# Altium footprint library PcbLib.PcbLib: 142 footprints (part 2 of 9)
Each footprint in its own frame and in the unit in brackets; x right, y up, seen from the top. Pads: shape width x height; smd on the part's side, far side on the other; paste and mask are expansions set on the pad; w line width, h text height; cw(c..) or ccw(c..) is an arc to the next point about the centre after c.
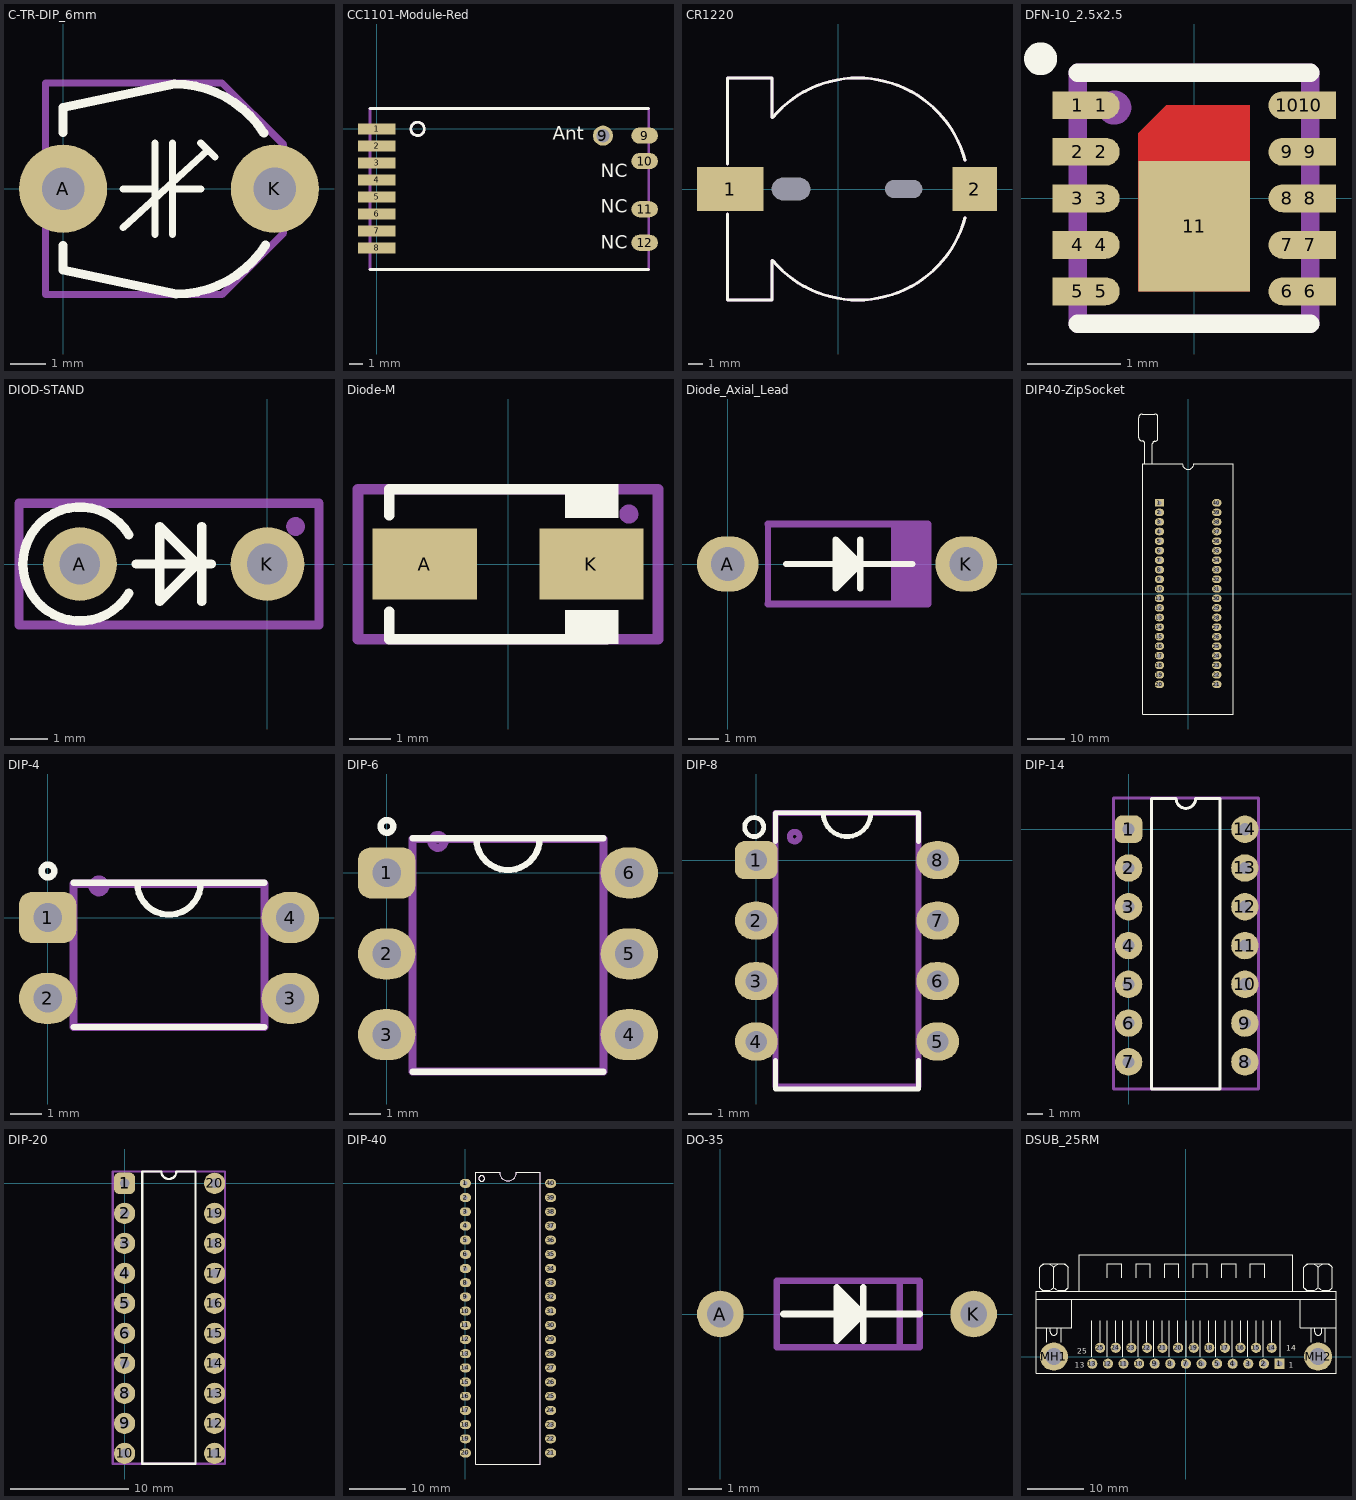
[diagram p1: the footprints below, top view; thin cyan lines are the x and y axes]

## C-TR-DIP_6mm [mm]
pads (2):
  round 2.5 hole 1.2 mask+0.102: A(0,0) K(6,0)
Top Overlay:
  lines w0.2: 1.7,-1.1 4.1,1.1 3.9,1.3 4.3,0.9 ; 1.7,0 2.6,0 ; 2.6,-1.3 2.6,1.3 ; 3.1,-1.3 3.1,1.3 ; 3.1,0 3.9,0
  lines w0.254: 0,-1.6 0,-2.3 3.204,-2.982 ccw(c3.204,0.02) 5.74,-1.586 ; 0,1.6 0,2.3 3.152,2.971 cw(c3.152,-0.031) 5.688,1.575
Mechanical 29:
  lines w0.2: -0.5,-3 -0.5,3 4.5,3 6.25,1.25 6.25,-1.25 4.5,-3 -0.5,-3
  text ".Designator" at 1.7,-0.467 h1
3D body "Trimmer Cap - Green.stp": height 5.08, standoff -2.53, extent -0.556,-3.046 6.207,3.046

## CC1101-Module-Red [mm]
pads (13):
  rect 2.8x0.8 smd: 1(0,0) 2(0,-1.27) 3(0,-2.54) 4(0,-3.81) 5(0,-5.08) 6(0,-6.35) 7(0,-7.62) 8(0,-8.89)
  round 1.5 hole 1: 9(16.891,-0.508)
  oval 2x1.2 smd: 9(20,-0.5) 10(20,-2.4) 11(20,-6) 12(20,-8.5)
Top Overlay:
  circle w0.2: c3.048,0 r0.5
  lines w0.2: -0.508,-10.5 20.292,-10.5 ; -0.508,1.524 20.292,1.524
  text "Ant" at 13.154,-0.816 h1
  text "NC" at 16.71,-3.61 h1
  text "NC" at 16.71,-6.277 h1
  text "NC" at 16.71,-8.944 h1
Mechanical 29:
  circle w0.2: c3.048,0 r0.5
  lines w0.2: -0.508,-10.5 -0.508,1.5 20.32,1.5 20.32,-10.5 -0.508,-10.5
  text ".Designator" at 6.2,-5.634 h2
3D body: height 0.8, standoff 0, extent -0.508,-10.5 20.32,1.5
3D body: height 2, standoff 1, extent 5.5,-5 10,-1
3D body: height 1.5, standoff 1, extent 6.5,-9.5 9.5,-7.5

## CR1220 [mm] "COIN CELL BATTERY HOLDER 1220 12mm"
height 2
pads (4):
  rect 4.5x3 smd: 1(-7.3,0)
  rect 3x3 smd: 2(9.2,0)
  round 1 hole 1.5 slot 2.6 at 0 deg unplated: ""(-3.2,0)
  round 1 hole 1.2 slot 2.5 at 0 deg unplated: ""(4.4,0)
Top Overlay:
  lines w0.2: -7.5,-1.7 -7.5,-7.5 -4.5,-7.5 -4.5,-4.821 ; -7.5,1.7 -7.5,7.5 -4.5,7.5 -4.5,4.821 ; -4.445,-4.821 ccw(c1.3,0) 8.544,-1.941 ; -4.445,4.821 cw(c1.3,0) 8.544,1.941
Mechanical 29:
  lines w0.2: -7.5,-1.7 -7.5,-7.5 -4.5,-7.5 -4.5,-4.821 ; -7.5,1.7 -7.5,7.5 -4.5,7.5 -4.5,4.821 ; -4.445,-4.821 ccw(c1.3,0) 8.544,-1.941 ; -4.445,4.821 cw(c1.3,0) 8.544,1.941
  text ".Designator" at -2.6,-1.6 h3
3D body "SMD Battery Holder.step": height 4.26, standoff -0.49, extent -8.5,-7.4 10.3,7.349

## DFN-10_2.5x2.5 [mm]
pads (21):
  rect 0.55x0.3 smd paste+0 mask+0.04: 1(-1.25,1) 2(-1.25,0.5) 3(-1.25,0) 4(-1.25,-0.5) 5(-1.25,-1) 6(1.25,-1) 7(1.25,-0.5) 8(1.25,0) 9(1.25,0.5) 10(1.25,1)
  oval 0.4x0.3 smd paste+0 mask+0.04: 1(-1,1) 2(-1,0.5) 3(-1,0) 4(-1,-0.5) 5(-1,-1) 6(1,-1) 7(1,-0.5) 8(1,0) 9(1,0.5) 10(1,1)
  rect 1.2x1.4 smd paste+0 mask+0.04: 11(0,-0.3)
Top Layer:
  region: -0.6,-1 0.6,-1 0.6,1 -0.3,1 -0.6,0.7
Top Overlay:
  circle w0.254: c-1.65,1.5 r0.05
  lines w0.2: -1.25,-1.35 1.25,-1.35 ; -1.25,1.35 1.25,1.35
Mechanical 29:
  circle w0.254: c-0.859,0.975 r0.056
  lines w0.2: -1.25,-1.35 1.25,-1.35 1.25,1.35 -1.25,1.35 -1.25,-1.35
  text ".Designator" at -0.7,-0.408 h0.8
3D body "Assem2.STEP": height 0.79, standoff -0.01, extent -1.26,-1.25 1.26,1.25

## DIOD-STAND [mm]
pads (2):
  round 2 hole 1.1: A(-5.08,0) K(0,0)
Top Overlay:
  lines w0.254: -3.755,-0.795 cw(c-5.08,0) -3.755,0.795 ; -3.556,0 -1.778,0 ; -1.778,-1.016 -1.778,1.016 ; -1.524,0 -1.905,0 ; -1.905,0 -2.921,-1.016 -2.921,1.016 -1.905,0
Mechanical 29:
  circle w0.254: c0.762,1.016 r0.127
  lines w0.254: -6.731,-1.651 1.397,-1.651 1.397,1.651 -6.731,1.651 -6.731,-1.651
  text ".Designator" at -4.572,-0.429 h1
3D body "stand-diod.STEP": height 7.78, standoff -1.5, extent -5.48,-1.505 1.425,1.505

## Diode-M [mm]
pads (2):
  rect 2.5x1.7 smd: A(-2,0) K(2,0)
Top Overlay:
  rectangle: 1.372,-1.923 2.65,-1.098
  rectangle: 1.372,1.1 2.65,1.925
  lines w0.254: -2.852,-1.8 2.375,-1.8 ; -2.852,-1.777 -2.852,-1.146 ; -2.848,1.168 -2.848,1.8 -2.7,1.8 2.375,1.8 ; 2.375,1.8 2.375,1.8
Mechanical 29:
  circle w0.254: c2.9,1.2 r0.1
  lines w0.254: -3.6,-1.8 3.6,-1.8 3.6,1.6 3.6,1.8 -1,1.8 -3.6,1.8 -3.6,-1.8
  text ".Designator" at -1.646,-0.413 h1
3D body "Diode SMD 1N4007-1.step": height 2.5, standoff 0.07, extent -2.65,-1.555 2.65,1.555

## Diode_Axial_Lead [mm]
pads (2):
  oval 2x1.8 hole 1.1: A(0,0) K(7.74,0)
Top Overlay:
  region: 3.5,0.8 4.3,0 3.5,-0.8
  lines w0.2: 1.9,0 6,0 ; 4.3,-0.8 4.3,0.8 ; 3.5,-0.8 4.3,0 3.5,0.8 3.5,-0.8
Mechanical 29:
  region: 1.3,-1.4 1.258,-1.4 1.2,-1.342 1.2,-1.258 1.258,-1.2 1.3,-1.2 5.3,-1.2 5.3,1.2 1.3,1.2 1.258,1.2 1.2,1.258 1.2,1.342 1.258,1.4 1.3,1.4 6.5,1.4 6.52,1.4 6.557,1.385 6.585,1.357 6.6,1.32 6.6,1.3 6.6,-1.3 6.6,-1.32 6.585,-1.357 6.557,-1.385 6.52,-1.4 6.5,-1.4
  lines w0.2: 5.4,-1.3 5.4,1.3 ; 1.3,-1.3 1.3,1.3 6.5,1.3 6.5,-1.3 1.3,-1.3
  text ".Designator" at 2.2,-0.367 h1
3D body "1n5819.STEP": height 2.85, standoff -0.5, extent -0.43,-1.351 8.17,1.351

## DIP40-ZipSocket [mm]
pads (40):
  rect 2.5x2 hole 1.1: 1(-7.62,24.13)
  oval 2.5x2 hole 1.1: 2(-7.62,21.59) 3(-7.62,19.05) 4(-7.62,16.51) 5(-7.62,13.97) 6(-7.62,11.43) 7(-7.62,8.89) 8(-7.62,6.35) 9(-7.62,3.81) 10(-7.62,1.27) 11(-7.62,-1.27) 12(-7.62,-3.81) 13(-7.62,-6.35) 14(-7.62,-8.89) 15(-7.62,-11.43) 16(-7.62,-13.97) 17(-7.62,-16.51) 18(-7.62,-19.05) 19(-7.62,-21.59) 20(-7.62,-24.13) 21(7.62,-24.13) 22(7.62,-21.59) 23(7.62,-19.05) 24(7.62,-16.51) 25(7.62,-13.97) 26(7.62,-11.43) 27(7.62,-8.89) 28(7.62,-6.35) 29(7.62,-3.81) 30(7.62,-1.27) 31(7.62,1.27) 32(7.62,3.81) 33(7.62,6.35) 34(7.62,8.89) 35(7.62,11.43) 36(7.62,13.97) 37(7.62,16.51) 38(7.62,19.05) 39(7.62,21.59) 40(7.62,24.13)
Top Overlay:
  lines w0.2: -11.557,34.5 -11.557,39.903 ccw(c-12.243,39.903) -12.243,40.589 cw(c-12.243,41.478) -13.132,41.478 -13.132,46.812 cw(c-12.198,46.812) -12.198,47.746 -8.808,47.746 cw(c-8.808,46.965) -8.026,46.965 -8.026,41.269 cw(c-8.808,41.269) -8.808,40.488 ccw(c-8.808,39.795) -9.5,39.795 -9.5,34.5 ; -12,-32 -12,34.5 -1.5,34.5 ccw(c0,34.5) 1.5,34.5 12,34.5 12,-32 -12,-32
3D body "Zif-Zip Socket.STEP": height 21.95, standoff -2.53, extent -12.975,-31.475 11.501,41.579

## DIP-4 [mm] "DIP, pitch 2.54mm, 300mil Width"
pads (4):
  rrect50% 1.8x1.6 hole 0.9: 1(0,0)
  oval 1.8x1.6 hole 0.9: 2(0,-2.54) 3(7.62,-2.54) 4(7.62,0)
Top Overlay:
  circle w0.2: c0.01,1.46 r0.2
  lines w0.2: 0.81,-3.44 6.81,-3.44 ; 0.81,1.09 6.81,1.09 ; 2.81,1.09 ccw(c3.81,1.09) 4.81,1.09
Mechanical 29:
  circle w0.254: c1.61,0.99 r0.2
  lines w0.254: 0.81,-3.44 6.81,-3.44 6.81,1.06 0.81,1.06 0.81,-3.44
  text ".Designator" at 4.077,-2.07 h1
3D body "User Library-DIP4.step": height 4.25, standoff -2.05, extent -0.125,-3.514 7.745,1.08

## DIP-6 [mm] "DIP, pitch 2.54mm, 300mil Width"
pads (6):
  rrect50% 1.8x1.6 hole 0.9: 1(0,0)
  oval 1.8x1.6 hole 0.9: 2(0,-2.54) 3(0,-5.08) 4(7.62,-5.08) 5(7.62,-2.54) 6(7.62,0)
Top Overlay:
  circle w0.2: c0.01,1.46 r0.2
  lines w0.2: 0.81,-6.24 6.81,-6.24 ; 0.81,1.09 6.81,1.09 ; 2.81,1.09 ccw(c3.81,1.09) 4.81,1.09
Mechanical 29:
  circle w0.254: c1.61,0.99 r0.2
  lines w0.254: 0.81,-6.24 6.81,-6.24 6.81,1.06 0.81,1.06 0.81,-6.24
  text ".Designator" at 4.077,-3.54 h1
3D body "User Library-DIP6-White.STEP": height 4.8, standoff -2.5, extent -0.19,-6.16 7.68,0.96

## DIP-8 [mm] "DIP, pitch 2.54mm, 300mil Width"
pads (8):
  rrect50% 1.8x1.6 hole 0.9: 1(0,0)
  oval 1.8x1.6 hole 0.9: 2(0,-2.54) 3(0,-5.08) 4(0,-7.62) 5(7.62,-7.62) 6(7.62,-5.08) 7(7.62,-2.54) 8(7.62,0)
Top Overlay:
  circle w0.2: c-0.09,1.39 r0.4
  lines w0.2: 0.81,-8.41 0.81,-9.61 6.81,-9.61 6.81,-8.41 ; 0.81,0.79 0.81,1.99 6.81,1.99 6.81,0.79 ; 2.81,1.99 ccw(c3.81,1.99) 4.81,1.99
Mechanical 29:
  circle w0.254: c1.61,0.99 r0.2
  lines w0.254: 0.81,-9.51 0.81,1.99 6.81,1.99 6.81,-9.51 0.81,-9.51
  text ".Designator" at 3.977,-5.61 h1
3D body "CircuitWorks-DIP8.step": height 4.19, standoff -2.67, extent -0.127,-9.51 7.747,1.92

## DIP-14 [mm]
pads (14):
  rrect50% 1.8x1.8 hole 0.8: 1(0,0)
  round 1.8 hole 0.8: 2(0,-2.54) 3(0,-5.08) 4(0,-7.62) 5(0,-10.16) 6(0,-12.7) 7(0,-15.24) 8(7.62,-15.24) 9(7.62,-12.7) 10(7.62,-10.16) 11(7.62,-7.62) 12(7.62,-5.08) 13(7.62,-2.54) 14(7.62,0)
Top Overlay:
  lines w0.2: 1.5,-17.018 6,-17.018 6,2 4.385,2 cw(c3.75,2) 3.115,2 1.5,2 1.5,-17.018
Mechanical 29:
  circle w0.254: c0,0 r0.5
  lines w0.2: -1,-17.018 -1,2.032 8.5,2.032 8.5,-17.018 -1,-17.018
  text ".Designator" at 4.293,-9.579 h1
3D body "CircuitWorks-DIP-14.STEP": height 4.51, standoff -2.47, extent -0.126,-17.145 7.874,1.905

## DIP-20 [mm]
pads (20):
  rrect50% 1.8x1.8 hole 0.8: 1(0,0)
  round 1.8 hole 0.8: 2(0,-2.54) 3(0,-5.08) 4(0,-7.62) 5(0,-10.16) 6(0,-12.7) 7(0,-15.24) 8(0,-17.78) 9(0,-20.32) 10(0,-22.86) 11(7.62,-22.86) 12(7.62,-20.32) 13(7.62,-17.78) 14(7.62,-15.24) 15(7.62,-12.7) 16(7.62,-10.16) 17(7.62,-7.62) 18(7.62,-5.08) 19(7.62,-2.54) 20(7.62,0)
Top Overlay:
  lines w0.2: 1.5,-23.75 6,-23.75 6,1 4.385,1 cw(c3.75,1) 3.115,1 1.5,1 1.5,-23.75
Mechanical 29:
  circle w0.254: c0,0 r0.5
  lines w0.2: -1,-23.75 -1,1 8.5,1 8.5,-23.75 -1,-23.75
  text ".Designator" at 4.217,-14.8 h1
3D body "74HC245_DIP20_TOSHIBA_MODEL.STEP": height 4.48, standoff -2.83, extent -0.102,-23.736 7.768,0.864

## DIP-40 [mm]
pads (40):
  oval 2x1.6 hole 0.8: 1(0,0) 2(0,-2.54) 3(0,-5.08) 4(0,-7.62) 5(0,-10.16) 6(0,-12.7) 7(0,-15.24) 8(0,-17.78) 9(0,-20.32) 10(0,-22.86) 11(0,-25.4) 12(0,-27.94) 13(0,-30.48) 14(0,-33.02) 15(0,-35.56) 16(0,-38.1) 17(0,-40.64) 18(0,-43.18) 19(0,-45.72) 20(0,-48.26) 21(15.24,-48.26) 22(15.24,-45.72) 23(15.24,-43.18) 24(15.24,-40.64) 25(15.24,-38.1) 26(15.24,-35.56) 27(15.24,-33.02) 28(15.24,-30.48) 29(15.24,-27.94) 30(15.24,-25.4) 31(15.24,-22.86) 32(15.24,-20.32) 33(15.24,-17.78) 34(15.24,-15.24) 35(15.24,-12.7) 36(15.24,-10.16) 37(15.24,-7.62) 38(15.24,-5.08) 39(15.24,-2.54) 40(15.24,0)
Top Overlay:
  circle w0.2: c2.92,0.87 r0.51
  lines w0.2: 1.82,-50.23 13.42,-50.23 13.42,1.97 9.12,1.97 cw(c7.62,1.97) 6.12,1.97 1.82,1.97 1.82,-50.23
Mechanical 29:
  circle w0.2: c2.92,0.87 r0.51
  lines w0.2: 1.82,-50.23 13.42,-50.23 13.42,1.97 9.12,1.97 cw(c7.62,1.97) 6.12,1.97 1.82,1.97 1.82,-50.23
  text ".Designator" at 8.087,-25.93 h1
3D body "ATMEGA16-16PU.stp": height 5.83, standoff -2.5, extent -0.299,-50.292 15.538,2.032

## DO-35 [mm]
pads (2):
  round 1.4 hole 0.8: A(0,0) K(7.62,0)
Top Overlay:
  region: 3.5,0.8 4.3,0 3.5,-0.8
  lines w0.2: 1.9,0 6,0 ; 4.3,-0.8 4.3,0.8 ; 3.5,-0.8 3.5,0.8 4.3,0 3.5,-0.8
Mechanical 29:
  lines w0.2: 5.4,-1 5.4,1 ; 1.7,-1 6,-1 6,1 1.7,1 1.7,-1
  text ".Designator" at 2.2,-0.367 h1
3D body "User Library-1n4148-2.step": height 3, standoff -2.3, extent -0.31,-1 7.91,1

## DSUB_25RM [mm] "CONN, DSUB MINIATURE, 25 WAY, RIGHT-ANGLE, MALE"
pads (27):
  rect 1.8x1.8 hole 1 mask+0.1: 1(16.616,-1.27)
  round 1.8 hole 1 mask+0.1: 2(13.843,-1.27) 3(11.07,-1.27) 4(8.297,-1.27) 5(5.525,-1.27) 6(2.752,-1.27) 7(-0.021,-1.27) 8(-2.794,-1.27) 9(-5.567,-1.27) 10(-8.34,-1.27) 11(-11.112,-1.27) 12(-13.885,-1.27) 13(-16.658,-1.27) 14(15.24,1.57) 15(12.467,1.57) 16(9.694,1.57) 17(6.922,1.57) 18(4.149,1.57) 19(1.376,1.57) 20(-1.397,1.57) 21(-4.17,1.57) 22(-6.943,1.57) 23(-9.715,1.57) 24(-12.488,1.57) 25(-15.261,1.57)
  round 5 hole 3: MH1(-23.495,0) MH2(23.495,0)
Top Overlay:
  lines w0.2: -26.67,5.08 -20.32,5.08 -20.32,10.16 ; -26.67,10.16 26.67,10.16 ; -26.037,12.274 ccw(c-24.765,13.547) -23.493,12.274 ; -26.037,15.877 cw(c-24.765,14.605) -23.493,15.877 ; -25.4,11.642 -26.035,12.277 -26.035,15.875 -25.4,16.51 -21.59,16.51 -20.955,15.875 -20.955,12.277 -21.59,11.642 ; -24.765,2.54 -24.765,5.08 ; -24.13,5.08 -24.13,4.445 ccw(c-23.495,4.445) -22.86,4.445 -22.86,5.08 ; -23.497,12.274 ccw(c-22.225,13.547) -20.953,12.274 ; -23.497,15.877 cw(c-22.225,14.605) -20.953,15.877 ; -23.495,12.277 -23.495,15.875 ; -22.225,2.54 -22.225,5.08 ; -19,11.642 -19,18.1 19,18.1 19,11.642 ; -16.722,0 -16.722,6.35 ; -15.24,2.54 -15.24,6.35 ; -13.97,0 -13.97,6.35 ; -13.97,13.97 -13.97,16.51 -11.43,16.51 -11.43,13.97 ; -12.488,2.54 -12.488,6.35 ; -11.218,0 -11.218,6.35 ; -9.737,2.54 -9.737,6.35 ; -8.89,13.97 -8.89,16.51 -6.35,16.51 -6.35,13.97 ; -8.467,0 -8.467,6.35 ; -6.985,2.54 -6.985,6.35 ; -5.715,0 -5.715,6.35 ; -4.233,2.54 -4.233,6.35 ; -3.81,13.97 -3.81,16.51 -1.27,16.51 -1.27,13.97 ; -2.963,0 -2.963,6.35 ; -1.482,2.54 -1.482,6.35 ; 0,0 0,6.35 ; 1.27,2.54 1.27,6.35 ; 1.27,13.97 1.27,16.51 3.81,16.51 3.81,13.97 ; 2.54,0 2.54,6.35 ; 4.022,2.54 4.022,6.35 ; 5.292,0 5.292,6.35 ; 6.35,13.97 6.35,16.51 8.89,16.51 8.89,13.97 ; 6.985,2.54 6.985,6.35 ; 8.255,0 8.255,6.35 ; 9.737,2.54 9.737,6.35 ; 11.007,0 11.007,6.35 ; 11.43,13.97 11.43,16.51 13.97,16.51 13.97,13.97 ; 12.488,2.54 12.488,6.35 ; 13.758,0 13.758,6.35 ; 15.24,2.54 15.24,6.35 ; 16.722,0 16.722,6.35 ; 20.32,10.16 20.32,5.08 26.67,5.08 ; 20.953,12.274 ccw(c22.225,13.547) 23.497,12.274 ; 20.953,15.877 cw(c22.225,14.605) 23.497,15.877 ; 21.59,11.642 20.955,12.277 20.955,15.875 21.59,16.51 25.4,16.51 26.035,15.875 26.035,12.277 25.4,11.642 ; 22.225,2.54 22.225,5.08 ; 22.86,5.08 22.86,4.445 ccw(c23.495,4.445) 24.13,4.445 24.13,5.08 ; 23.493,12.274 ccw(c24.765,13.547) 26.037,12.274 ; 23.493,15.877 cw(c24.765,14.605) 26.037,15.877 ; 23.495,12.277 23.495,15.875 ; 24.765,2.54 24.765,5.08 ; -26.67,-2.963 26.67,-2.963 26.67,11.642 -26.67,11.642 -26.67,-2.963
  text "25" at -19.304,0.508 h1
  text "13" at -19.812,-2.032 h1
  text "1" at 18.288,-2.032 h1
  text "14" at 17.78,1.016 h1
3D body "connector_a-DSUB25RM_a_kg-t1.stp": height 12.57, standoff -4.3, extent -26.54,-2.9 26.5,18